# Altium schematic symbol library jlcpcb_2025_04_capacitors_extended_0402.schlib: 3594 symbols (part 16 of 20)
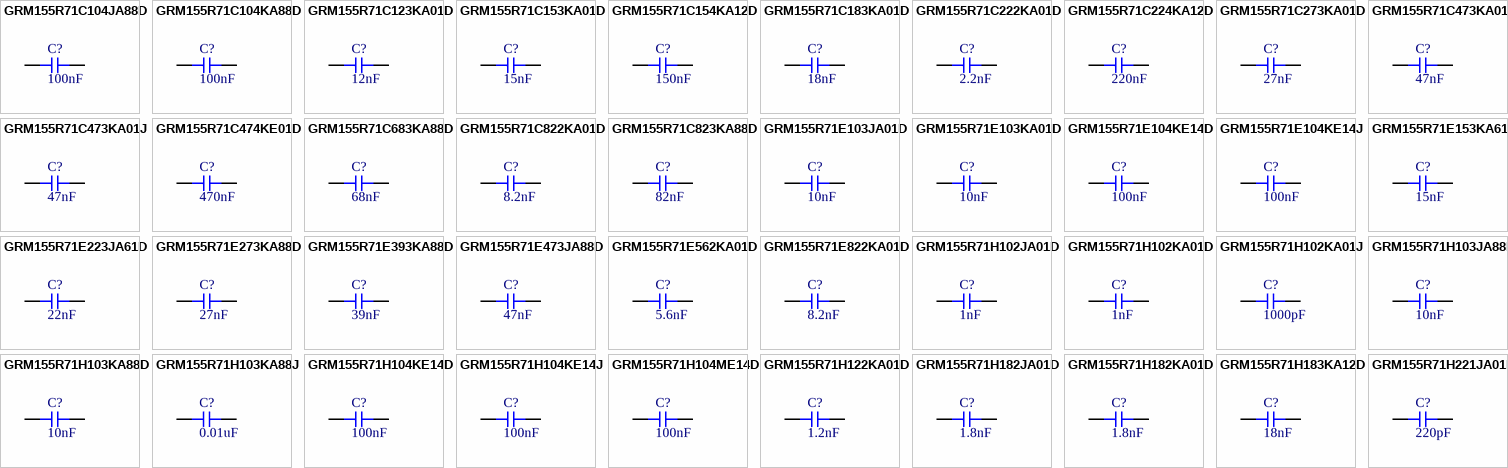
[diagram p104: symbols GRM155R71C104JA88D to GRM155R71H221JA01D]

## GRM155R71E153KA61D
designator C?  Capacitance: 15nF  (hidden comment: *)
Capacitor, Ceramic (MLCC), 15nF, ±10%, 25V, X7R, ±10%, SMD 0402; Manufacturer: Murata Electronics; Manufacturer Part Number: GRM155R71E153KA61D; Package Size: 0402; JLCPCB Basic Part: No; JLCPCB Part Number: C97869; Supplier 1: LCSC; Category: Capacitors - MLCC; Supplier Part Number 1: C97869; Tolerance: ±10%; Voltage Rating: 25V; Temperature Coefficient: X7R; RoHS: Yes; ComponentLink1Description: Datasheet; ComponentLink1URL: https://wmsc.lcsc.com/wmsc/upload/file/pdf/v2/lcsc/1811081531_Murata-Electronics-GRM155R71E153KA61D_C97869.pdf; ComponentLink2Description: JLCPCB Part URL; ComponentLink2URL: https://jlcpcb.com/partdetail/C97869; ComponentLink3Description: LCSC Part URL; ComponentLink3URL: https://lcsc.com/product-detail/Multilayer-Ceramic-Capacitors-MLCC---SMD-SMT_Murata-Electronics-Murata-Electronics-GRM155R71E153KA61D_C97869.html
footprint CAP-0402 (0402 (1005M) Capacitor)
pins: 1, 2

## GRM155R71E223JA61D
designator C?  Capacitance: 22nF  (hidden comment: *)
Capacitor, Ceramic (MLCC), 22nF, ±5%, 25V, X7R, ±5%, SMD 0402; Manufacturer: Murata Electronics; Manufacturer Part Number: GRM155R71E223JA61D; Package Size: 0402; JLCPCB Basic Part: No; JLCPCB Part Number: C426639; Supplier 1: LCSC; Category: Capacitors - MLCC; Supplier Part Number 1: C426639; Tolerance: ±5%; Voltage Rating: 25V; Temperature Coefficient: X7R; RoHS: Yes; ComponentLink1Description: Datasheet; ComponentLink1URL: https://wmsc.lcsc.com/wmsc/upload/file/pdf/v2/lcsc/2304140030_Murata-Electronics-GRM155R71E223JA61D_C426639.pdf; ComponentLink2Description: JLCPCB Part URL; ComponentLink2URL: https://jlcpcb.com/partdetail/C426639; ComponentLink3Description: LCSC Part URL; ComponentLink3URL: https://lcsc.com/product-detail/Multilayer-Ceramic-Capacitors-MLCC---SMD-SMT_Murata-Electronics-Murata-Electronics-GRM155R71E223JA61D_C426639.html
footprint CAP-0402 (0402 (1005M) Capacitor)
pins: 1, 2

## GRM155R71E273KA88D
designator C?  Capacitance: 27nF  (hidden comment: *)
Capacitor, Ceramic (MLCC), 27nF, ±10%, 25V, X7R, ±10%, SMD 0402; Manufacturer: Murata Electronics; Manufacturer Part Number: GRM155R71E273KA88D; Package Size: 0402; JLCPCB Basic Part: No; JLCPCB Part Number: C162187; Supplier 1: LCSC; Category: Capacitors - MLCC; Supplier Part Number 1: C162187; Tolerance: ±10%; Voltage Rating: 25V; Temperature Coefficient: X7R; RoHS: Yes; ComponentLink1Description: Datasheet; ComponentLink1URL: https://wmsc.lcsc.com/wmsc/upload/file/pdf/v2/lcsc/2304140030_Murata-Electronics-GRM155R71E273KA88D_C162187.pdf; ComponentLink2Description: JLCPCB Part URL; ComponentLink2URL: https://jlcpcb.com/partdetail/C162187; ComponentLink3Description: LCSC Part URL; ComponentLink3URL: https://lcsc.com/product-detail/Multilayer-Ceramic-Capacitors-MLCC---SMD-SMT_Murata-Electronics-Murata-Electronics-GRM155R71E273KA88D_C162187.html
footprint CAP-0402 (0402 (1005M) Capacitor)
pins: 1, 2

## GRM155R71E393KA88D
designator C?  Capacitance: 39nF  (hidden comment: *)
Capacitor, Ceramic (MLCC), 39nF, ±10%, 25V, X7R, ±10%, SMD 0402; Manufacturer: Murata Electronics; Manufacturer Part Number: GRM155R71E393KA88D; Package Size: 0402; JLCPCB Basic Part: No; JLCPCB Part Number: C117753; Supplier 1: LCSC; Category: Capacitors - MLCC; Supplier Part Number 1: C117753; Tolerance: ±10%; Voltage Rating: 25V; Temperature Coefficient: X7R; RoHS: Yes; ComponentLink1Description: Datasheet; ComponentLink1URL: https://wmsc.lcsc.com/wmsc/upload/file/pdf/v2/lcsc/2304140030_Murata-Electronics-GRM155R71E393KA88D_C117753.pdf; ComponentLink2Description: JLCPCB Part URL; ComponentLink2URL: https://jlcpcb.com/partdetail/C117753; ComponentLink3Description: LCSC Part URL; ComponentLink3URL: https://lcsc.com/product-detail/Multilayer-Ceramic-Capacitors-MLCC---SMD-SMT_Murata-Electronics-Murata-Electronics-GRM155R71E393KA88D_C117753.html
footprint CAP-0402 (0402 (1005M) Capacitor)
pins: 1, 2

## GRM155R71E473JA88D
designator C?  Capacitance: 47nF  (hidden comment: *)
Capacitor, Ceramic (MLCC), 47nF, ±5%, 25V, X7R, ±5%, SMD 0402; Manufacturer: Murata Electronics; Manufacturer Part Number: GRM155R71E473JA88D; Package Size: 0402; JLCPCB Basic Part: No; JLCPCB Part Number: C437528; Supplier 1: LCSC; Category: Capacitors - MLCC; Supplier Part Number 1: C437528; Tolerance: ±5%; Voltage Rating: 25V; Temperature Coefficient: X7R; RoHS: Yes; ComponentLink1Description: Datasheet; ComponentLink1URL: https://wmsc.lcsc.com/wmsc/upload/file/pdf/v2/lcsc/2304140030_Murata-Electronics-GRM155R71E473JA88D_C437528.pdf; ComponentLink2Description: JLCPCB Part URL; ComponentLink2URL: https://jlcpcb.com/partdetail/C437528; ComponentLink3Description: LCSC Part URL; ComponentLink3URL: https://lcsc.com/product-detail/Multilayer-Ceramic-Capacitors-MLCC---SMD-SMT_Murata-Electronics-Murata-Electronics-GRM155R71E473JA88D_C437528.html
footprint CAP-0402 (0402 (1005M) Capacitor)
pins: 1, 2

## GRM155R71E562KA01D
designator C?  Capacitance: 5.6nF  (hidden comment: *)
Capacitor, Ceramic (MLCC), 5.6nF, ±10%, 25V, X7R, ±10%, SMD 0402; Manufacturer: Murata Electronics; Manufacturer Part Number: GRM155R71E562KA01D; Package Size: 0402; JLCPCB Basic Part: No; JLCPCB Part Number: C162188; Supplier 1: LCSC; Category: Capacitors - MLCC; Supplier Part Number 1: C162188; Tolerance: ±10%; Voltage Rating: 25V; Temperature Coefficient: X7R; RoHS: Yes; ComponentLink1Description: Datasheet; ComponentLink1URL: https://wmsc.lcsc.com/wmsc/upload/file/pdf/v2/lcsc/2101081032_Murata-Electronics-GRM155R71E562KA01D_C162188.pdf; ComponentLink2Description: JLCPCB Part URL; ComponentLink2URL: https://jlcpcb.com/partdetail/C162188; ComponentLink3Description: LCSC Part URL; ComponentLink3URL: https://lcsc.com/product-detail/Multilayer-Ceramic-Capacitors-MLCC---SMD-SMT_Murata-Electronics-Murata-Electronics-GRM155R71E562KA01D_C162188.html
footprint CAP-0402 (0402 (1005M) Capacitor)
pins: 1, 2

## GRM155R71E822KA01D
designator C?  Capacitance: 8.2nF  (hidden comment: *)
Capacitor, Ceramic (MLCC), 8.2nF, ±10%, 25V, X7R, ±10%, SMD 0402; Manufacturer: Murata Electronics; Manufacturer Part Number: GRM155R71E822KA01D; Package Size: 0402; JLCPCB Basic Part: No; JLCPCB Part Number: C701314; Supplier 1: LCSC; Category: Capacitors - MLCC; Supplier Part Number 1: C701314; Tolerance: ±10%; Voltage Rating: 25V; Temperature Coefficient: X7R; RoHS: Yes; ComponentLink1Description: Datasheet; ComponentLink1URL: https://wmsc.lcsc.com/wmsc/upload/file/pdf/v2/lcsc/2304140030_Murata-Electronics-GRM155R71E822KA01D_C701314.pdf; ComponentLink2Description: JLCPCB Part URL; ComponentLink2URL: https://jlcpcb.com/partdetail/C701314; ComponentLink3Description: LCSC Part URL; ComponentLink3URL: https://lcsc.com/product-detail/Multilayer-Ceramic-Capacitors-MLCC---SMD-SMT_Murata-Electronics-Murata-Electronics-GRM155R71E822KA01D_C701314.html
footprint CAP-0402 (0402 (1005M) Capacitor)
pins: 1, 2

## GRM155R71H102JA01D
designator C?  Capacitance: 1nF  (hidden comment: *)
Capacitor, Ceramic (MLCC), 1nF, ±5%, 50V, X7R, ±5%, SMD 0402; Manufacturer: Murata Electronics; Manufacturer Part Number: GRM155R71H102JA01D; Package Size: 0402; JLCPCB Basic Part: No; JLCPCB Part Number: C397298; Supplier 1: LCSC; Category: Capacitors - MLCC; Supplier Part Number 1: C397298; Tolerance: ±5%; Voltage Rating: 50V; Temperature Coefficient: X7R; RoHS: Yes; ComponentLink1Description: Datasheet; ComponentLink1URL: https://wmsc.lcsc.com/wmsc/upload/file/pdf/v2/lcsc/1912111437_Murata-Electronics-GRM155R71H102JA01D_C397298.pdf; ComponentLink2Description: JLCPCB Part URL; ComponentLink2URL: https://jlcpcb.com/partdetail/C397298; ComponentLink3Description: LCSC Part URL; ComponentLink3URL: https://lcsc.com/product-detail/Multilayer-Ceramic-Capacitors-MLCC---SMD-SMT_Murata-Electronics-Murata-Electronics-GRM155R71H102JA01D_C397298.html
footprint CAP-0402 (0402 (1005M) Capacitor)
pins: 1, 2

## GRM155R71H102KA01D
designator C?  Capacitance: 1nF  (hidden comment: *)
Capacitor, Ceramic (MLCC), 1nF, ±10%, 50V, X7R, ±10%, SMD 0402; Manufacturer: Murata Electronics; Manufacturer Part Number: GRM155R71H102KA01D; Package Size: 0402; JLCPCB Basic Part: No; JLCPCB Part Number: C77018; Supplier 1: LCSC; Category: Capacitors - MLCC; Supplier Part Number 1: C77018; Tolerance: ±10%; Voltage Rating: 50V; Temperature Coefficient: X7R; RoHS: Yes; ComponentLink1Description: Datasheet; ComponentLink1URL: https://wmsc.lcsc.com/wmsc/upload/file/pdf/v2/lcsc/1811081615_Murata-Electronics-GRM155R71H102KA01D_C77018.pdf; ComponentLink2Description: JLCPCB Part URL; ComponentLink2URL: https://jlcpcb.com/partdetail/C77018; ComponentLink3Description: LCSC Part URL; ComponentLink3URL: https://lcsc.com/product-detail/Multilayer-Ceramic-Capacitors-MLCC---SMD-SMT_Murata-Electronics-Murata-Electronics-GRM155R71H102KA01D_C77018.html
footprint CAP-0402 (0402 (1005M) Capacitor)
pins: 1, 2

## GRM155R71H102KA01J
designator C?  Capacitance: 1000pF  (hidden comment: *)
Capacitor, Ceramic (MLCC), 1000pF, ±10%, null, X7R, ±10%, SMD 0402; Manufacturer: Murata Electronics; Manufacturer Part Number: GRM155R71H102KA01J; Package Size: 0402; JLCPCB Basic Part: No; JLCPCB Part Number: C3011658; Supplier 1: LCSC; Category: Capacitors - MLCC; Supplier Part Number 1: C3011658; Tolerance: ±10%; Voltage Rating: null; Temperature Coefficient: X7R; RoHS: Yes; ComponentLink1Description: Datasheet; ComponentLink1URL: https://wmsc.lcsc.com/wmsc/upload/file/pdf/v2/lcsc/2301111830_Murata-Electronics-GRM155R71H102KA01J_C3011658.pdf; ComponentLink2Description: JLCPCB Part URL; ComponentLink2URL: https://jlcpcb.com/partdetail/C3011658; ComponentLink3Description: LCSC Part URL; ComponentLink3URL: https://lcsc.com/product-detail/Multilayer-Ceramic-Capacitors-MLCC---SMD-SMT_Murata-Electronics-Murata-Electronics-GRM155R71H102KA01J_C3011658.html
footprint CAP-0402 (0402 (1005M) Capacitor)
pins: 1, 2

## GRM155R71H103JA88D
designator C?  Capacitance: 10nF  (hidden comment: *)
Capacitor, Ceramic (MLCC), 10nF, ±5%, 50V, X7R, ±5%, SMD 0402; Manufacturer: Murata Electronics; Manufacturer Part Number: GRM155R71H103JA88D; Package Size: 0402; JLCPCB Basic Part: No; JLCPCB Part Number: C162190; Supplier 1: LCSC; Category: Capacitors - MLCC; Supplier Part Number 1: C162190; Tolerance: ±5%; Voltage Rating: 50V; Temperature Coefficient: X7R; RoHS: Yes; ComponentLink1Description: Datasheet; ComponentLink1URL: https://wmsc.lcsc.com/wmsc/upload/file/pdf/v2/lcsc/2304140030_Murata-Electronics-GRM155R71H103JA88D_C162190.pdf; ComponentLink2Description: JLCPCB Part URL; ComponentLink2URL: https://jlcpcb.com/partdetail/C162190; ComponentLink3Description: LCSC Part URL; ComponentLink3URL: https://lcsc.com/product-detail/Multilayer-Ceramic-Capacitors-MLCC---SMD-SMT_Murata-Electronics-Murata-Electronics-GRM155R71H103JA88D_C162190.html
footprint CAP-0402 (0402 (1005M) Capacitor)
pins: 1, 2

## GRM155R71H103KA88D
designator C?  Capacitance: 10nF  (hidden comment: *)
Capacitor, Ceramic (MLCC), 10nF, ±10%, 50V, X7R, ±10%, SMD 0402; Manufacturer: Murata Electronics; Manufacturer Part Number: GRM155R71H103KA88D; Package Size: 0402; JLCPCB Basic Part: No; JLCPCB Part Number: C77019; Supplier 1: LCSC; Category: Capacitors - MLCC; Supplier Part Number 1: C77019; Tolerance: ±10%; Voltage Rating: 50V; Temperature Coefficient: X7R; RoHS: Yes; ComponentLink1Description: Datasheet; ComponentLink1URL: https://wmsc.lcsc.com/wmsc/upload/file/pdf/v2/lcsc/1809251103_Murata-Electronics-GRM155R71H103KA88D_C77019.pdf; ComponentLink2Description: JLCPCB Part URL; ComponentLink2URL: https://jlcpcb.com/partdetail/C77019; ComponentLink3Description: LCSC Part URL; ComponentLink3URL: https://lcsc.com/product-detail/Multilayer-Ceramic-Capacitors-MLCC---SMD-SMT_Murata-Electronics-Murata-Electronics-GRM155R71H103KA88D_C77019.html
footprint CAP-0402 (0402 (1005M) Capacitor)
pins: 1, 2

## GRM155R71H103KA88J
designator C?  Capacitance: 0.01uF  (hidden comment: *)
Capacitor, Ceramic (MLCC), 0.01uF, 50V, X7R, SMD 0402; Manufacturer: Murata Electronics; Manufacturer Part Number: GRM155R71H103KA88J; Package Size: 0402; JLCPCB Basic Part: No; JLCPCB Part Number: C2840480; Supplier 1: LCSC; Category: Capacitors - MLCC; Supplier Part Number 1: C2840480; Voltage Rating: 50V; Temperature Coefficient: X7R; RoHS: Yes; ComponentLink1Description: Datasheet; ComponentLink1URL: https://wmsc.lcsc.com/wmsc/upload/file/pdf/v2/lcsc/2301062030_Murata-Electronics-GRM155R71H103KA88J_C2840480.pdf; ComponentLink2Description: JLCPCB Part URL; ComponentLink2URL: https://jlcpcb.com/partdetail/C2840480; ComponentLink3Description: LCSC Part URL; ComponentLink3URL: https://lcsc.com/product-detail/Multilayer-Ceramic-Capacitors-MLCC---SMD-SMT_Murata-Electronics-Murata-Electronics-GRM155R71H103KA88J_C2840480.html
footprint CAP-0402 (0402 (1005M) Capacitor)
pins: 1, 2

## GRM155R71H104KE14D
designator C?  Capacitance: 100nF  (hidden comment: *)
Capacitor, Ceramic (MLCC), 100nF, ±10%, 50V, X7R, ±10%, SMD 0402; Manufacturer: Murata Electronics; Manufacturer Part Number: GRM155R71H104KE14D; Package Size: 0402; JLCPCB Basic Part: No; JLCPCB Part Number: C77020; Supplier 1: LCSC; Category: Capacitors - MLCC; Supplier Part Number 1: C77020; Tolerance: ±10%; Voltage Rating: 50V; Temperature Coefficient: X7R; RoHS: Yes; ComponentLink1Description: Datasheet; ComponentLink1URL: https://wmsc.lcsc.com/wmsc/upload/file/pdf/v2/lcsc/1809272047_Murata-Electronics-GRM155R71H104KE14D_C77020.pdf; ComponentLink2Description: JLCPCB Part URL; ComponentLink2URL: https://jlcpcb.com/partdetail/C77020; ComponentLink3Description: LCSC Part URL; ComponentLink3URL: https://lcsc.com/product-detail/Multilayer-Ceramic-Capacitors-MLCC---SMD-SMT_Murata-Electronics-Murata-Electronics-GRM155R71H104KE14D_C77020.html
footprint CAP-0402 (0402 (1005M) Capacitor)
pins: 1, 2

## GRM155R71H104KE14J
designator C?  Capacitance: 100nF  (hidden comment: *)
Capacitor, Ceramic (MLCC), 100nF, ±10%, null, X7R, ±10%, SMD 0402; Manufacturer: Murata Electronics; Manufacturer Part Number: GRM155R71H104KE14J; Package Size: 0402; JLCPCB Basic Part: No; JLCPCB Part Number: C2649519; Supplier 1: LCSC; Category: Capacitors - MLCC; Supplier Part Number 1: C2649519; Tolerance: ±10%; Voltage Rating: null; Temperature Coefficient: X7R; RoHS: Yes; ComponentLink1Description: Datasheet; ComponentLink1URL: https://wmsc.lcsc.com/wmsc/upload/file/pdf/v2/lcsc/2106080506_Murata-Electronics-GRM155R71H104KE14J_C2649519.pdf; ComponentLink2Description: JLCPCB Part URL; ComponentLink2URL: https://jlcpcb.com/partdetail/C2649519; ComponentLink3Description: LCSC Part URL; ComponentLink3URL: https://lcsc.com/product-detail/Multilayer-Ceramic-Capacitors-MLCC---SMD-SMT_Murata-Electronics-Murata-Electronics-GRM155R71H104KE14J_C2649519.html
footprint CAP-0402 (0402 (1005M) Capacitor)
pins: 1, 2

## GRM155R71H104ME14D
designator C?  Capacitance: 100nF  (hidden comment: *)
Capacitor, Ceramic (MLCC), 100nF, ±20%, 50V, X7R, ±20%, SMD 0402; Manufacturer: Murata Electronics; Manufacturer Part Number: GRM155R71H104ME14D; Package Size: 0402; JLCPCB Basic Part: No; JLCPCB Part Number: C182412; Supplier 1: LCSC; Category: Capacitors - MLCC; Supplier Part Number 1: C182412; Tolerance: ±20%; Voltage Rating: 50V; Temperature Coefficient: X7R; RoHS: Yes; ComponentLink1Description: Datasheet; ComponentLink1URL: https://wmsc.lcsc.com/wmsc/upload/file/pdf/v2/lcsc/2304140030_Murata-Electronics-GRM155R71H104ME14D_C182412.pdf; ComponentLink2Description: JLCPCB Part URL; ComponentLink2URL: https://jlcpcb.com/partdetail/C182412; ComponentLink3Description: LCSC Part URL; ComponentLink3URL: https://lcsc.com/product-detail/Multilayer-Ceramic-Capacitors-MLCC---SMD-SMT_Murata-Electronics-Murata-Electronics-GRM155R71H104ME14D_C182412.html
footprint CAP-0402 (0402 (1005M) Capacitor)
pins: 1, 2

## GRM155R71H122KA01D
designator C?  Capacitance: 1.2nF  (hidden comment: *)
Capacitor, Ceramic (MLCC), 1.2nF, ±10%, 50V, X7R, ±10%, SMD 0402; Manufacturer: Murata Electronics; Manufacturer Part Number: GRM155R71H122KA01D; Package Size: 0402; JLCPCB Basic Part: No; JLCPCB Part Number: C116368; Supplier 1: LCSC; Category: Capacitors - MLCC; Supplier Part Number 1: C116368; Tolerance: ±10%; Voltage Rating: 50V; Temperature Coefficient: X7R; RoHS: Yes; ComponentLink1Description: Datasheet; ComponentLink1URL: https://wmsc.lcsc.com/wmsc/upload/file/pdf/v2/lcsc/2304140030_Murata-Electronics-GRM155R71H122KA01D_C116368.pdf; ComponentLink2Description: JLCPCB Part URL; ComponentLink2URL: https://jlcpcb.com/partdetail/C116368; ComponentLink3Description: LCSC Part URL; ComponentLink3URL: https://lcsc.com/product-detail/Multilayer-Ceramic-Capacitors-MLCC---SMD-SMT_Murata-Electronics-Murata-Electronics-GRM155R71H122KA01D_C116368.html
footprint CAP-0402 (0402 (1005M) Capacitor)
pins: 1, 2

## GRM155R71H182JA01D
designator C?  Capacitance: 1.8nF  (hidden comment: *)
Capacitor, Ceramic (MLCC), 1.8nF, ±5%, 50V, X7R, ±5%, SMD 0402; Manufacturer: Murata Electronics; Manufacturer Part Number: GRM155R71H182JA01D; Package Size: 0402; JLCPCB Basic Part: No; JLCPCB Part Number: C85962; Supplier 1: LCSC; Category: Capacitors - MLCC; Supplier Part Number 1: C85962; Tolerance: ±5%; Voltage Rating: 50V; Temperature Coefficient: X7R; RoHS: Yes; ComponentLink1Description: Datasheet; ComponentLink1URL: https://wmsc.lcsc.com/wmsc/upload/file/pdf/v2/lcsc/2304140030_Murata-Electronics-GRM155R71H182JA01D_C85962.pdf; ComponentLink2Description: JLCPCB Part URL; ComponentLink2URL: https://jlcpcb.com/partdetail/C85962; ComponentLink3Description: LCSC Part URL; ComponentLink3URL: https://lcsc.com/product-detail/Multilayer-Ceramic-Capacitors-MLCC---SMD-SMT_Murata-Electronics-Murata-Electronics-GRM155R71H182JA01D_C85962.html
footprint CAP-0402 (0402 (1005M) Capacitor)
pins: 1, 2

## GRM155R71H182KA01D
designator C?  Capacitance: 1.8nF  (hidden comment: *)
Capacitor, Ceramic (MLCC), 1.8nF, ±10%, 50V, X7R, ±10%, SMD 0402; Manufacturer: Murata Electronics; Manufacturer Part Number: GRM155R71H182KA01D; Package Size: 0402; JLCPCB Basic Part: No; JLCPCB Part Number: C162192; Supplier 1: LCSC; Category: Capacitors - MLCC; Supplier Part Number 1: C162192; Tolerance: ±10%; Voltage Rating: 50V; Temperature Coefficient: X7R; RoHS: Yes; ComponentLink1Description: Datasheet; ComponentLink1URL: https://wmsc.lcsc.com/wmsc/upload/file/pdf/v2/lcsc/1912111437_Murata-Electronics-GRM155R71H182KA01D_C162192.pdf; ComponentLink2Description: JLCPCB Part URL; ComponentLink2URL: https://jlcpcb.com/partdetail/C162192; ComponentLink3Description: LCSC Part URL; ComponentLink3URL: https://lcsc.com/product-detail/Multilayer-Ceramic-Capacitors-MLCC---SMD-SMT_Murata-Electronics-Murata-Electronics-GRM155R71H182KA01D_C162192.html
footprint CAP-0402 (0402 (1005M) Capacitor)
pins: 1, 2

## GRM155R71H183KA12D
designator C?  Capacitance: 18nF  (hidden comment: *)
Capacitor, Ceramic (MLCC), 18nF, ±10%, 50V, X7R, ±10%, SMD 0402; Manufacturer: Murata Electronics; Manufacturer Part Number: GRM155R71H183KA12D; Package Size: 0402; JLCPCB Basic Part: No; JLCPCB Part Number: C437529; Supplier 1: LCSC; Category: Capacitors - MLCC; Supplier Part Number 1: C437529; Tolerance: ±10%; Voltage Rating: 50V; Temperature Coefficient: X7R; RoHS: Yes; ComponentLink1Description: Datasheet; ComponentLink1URL: https://wmsc.lcsc.com/wmsc/upload/file/pdf/v2/lcsc/2304140030_Murata-Electronics-GRM155R71H183KA12D_C437529.pdf; ComponentLink2Description: JLCPCB Part URL; ComponentLink2URL: https://jlcpcb.com/partdetail/C437529; ComponentLink3Description: LCSC Part URL; ComponentLink3URL: https://lcsc.com/product-detail/Multilayer-Ceramic-Capacitors-MLCC---SMD-SMT_Murata-Electronics-Murata-Electronics-GRM155R71H183KA12D_C437529.html
footprint CAP-0402 (0402 (1005M) Capacitor)
pins: 1, 2

## GRM155R71H221JA01D
designator C?  Capacitance: 220pF  (hidden comment: *)
Capacitor, Ceramic (MLCC), 220pF, ±5%, null, X7R, ±5%, SMD 0402; Manufacturer: Murata Electronics; Manufacturer Part Number: GRM155R71H221JA01D; Package Size: 0402; JLCPCB Basic Part: No; JLCPCB Part Number: C882535; Supplier 1: LCSC; Category: Capacitors - MLCC; Supplier Part Number 1: C882535; Tolerance: ±5%; Voltage Rating: null; Temperature Coefficient: X7R; RoHS: Yes; ComponentLink1Description: Datasheet; ComponentLink1URL: https://wmsc.lcsc.com/wmsc/upload/file/pdf/v2/lcsc/2201242130_Murata-Electronics-GRM155R71H221JA01D_C882535.pdf; ComponentLink2Description: JLCPCB Part URL; ComponentLink2URL: https://jlcpcb.com/partdetail/C882535; ComponentLink3Description: LCSC Part URL; ComponentLink3URL: https://lcsc.com/product-detail/Multilayer-Ceramic-Capacitors-MLCC---SMD-SMT_Murata-Electronics-Murata-Electronics-GRM155R71H221JA01D_C882535.html
footprint CAP-0402 (0402 (1005M) Capacitor)
pins: 1, 2

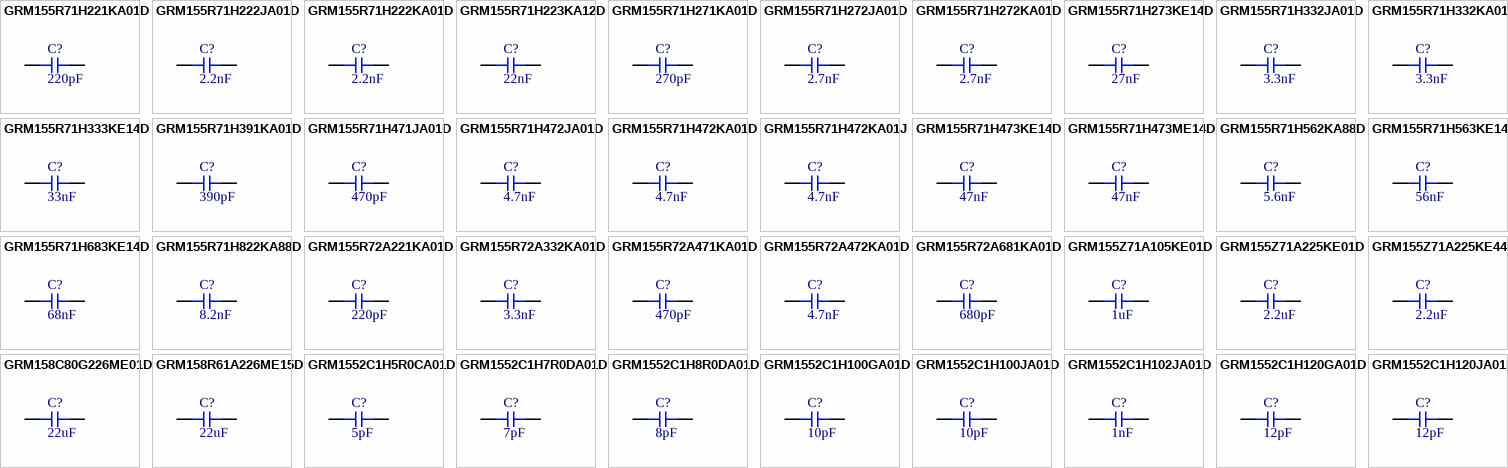
[diagram p70: symbols GRM155R71H221KA01D to GRM1552C1H120JA01D]

## GRM155R71H221KA01D
designator C?  Capacitance: 220pF  (hidden comment: *)
Capacitor, Ceramic (MLCC), 220pF, ±10%, 50V, X7R, ±10%, SMD 0402; Manufacturer: Murata Electronics; Manufacturer Part Number: GRM155R71H221KA01D; Package Size: 0402; JLCPCB Basic Part: No; JLCPCB Part Number: C97872; Supplier 1: LCSC; Category: Capacitors - MLCC; Supplier Part Number 1: C97872; Tolerance: ±10%; Voltage Rating: 50V; Temperature Coefficient: X7R; RoHS: Yes; ComponentLink1Description: Datasheet; ComponentLink1URL: https://wmsc.lcsc.com/wmsc/upload/file/pdf/v2/lcsc/1811081531_Murata-Electronics-GRM155R71H221KA01D_C97872.pdf; ComponentLink2Description: JLCPCB Part URL; ComponentLink2URL: https://jlcpcb.com/partdetail/C97872; ComponentLink3Description: LCSC Part URL; ComponentLink3URL: https://lcsc.com/product-detail/Multilayer-Ceramic-Capacitors-MLCC---SMD-SMT_Murata-Electronics-Murata-Electronics-GRM155R71H221KA01D_C97872.html
footprint CAP-0402 (0402 (1005M) Capacitor)
pins: 1, 2

## GRM155R71H222JA01D
designator C?  Capacitance: 2.2nF  (hidden comment: *)
Capacitor, Ceramic (MLCC), 2.2nF, ±5%, 50V, X7R, ±5%, SMD 0402; Manufacturer: Murata Electronics; Manufacturer Part Number: GRM155R71H222JA01D; Package Size: 0402; JLCPCB Basic Part: No; JLCPCB Part Number: C492066; Supplier 1: LCSC; Category: Capacitors - MLCC; Supplier Part Number 1: C492066; Tolerance: ±5%; Voltage Rating: 50V; Temperature Coefficient: X7R; RoHS: Yes; ComponentLink1Description: Datasheet; ComponentLink1URL: https://wmsc.lcsc.com/wmsc/upload/file/pdf/v2/lcsc/2308111638_Murata-Electronics-GRM155R71H222JA01D_C492066.pdf; ComponentLink2Description: JLCPCB Part URL; ComponentLink2URL: https://jlcpcb.com/partdetail/C492066; ComponentLink3Description: LCSC Part URL; ComponentLink3URL: https://lcsc.com/product-detail/Multilayer-Ceramic-Capacitors-MLCC---SMD-SMT_Murata-Electronics-Murata-Electronics-GRM155R71H222JA01D_C492066.html
footprint CAP-0402 (0402 (1005M) Capacitor)
pins: 1, 2

## GRM155R71H222KA01D
designator C?  Capacitance: 2.2nF  (hidden comment: *)
Capacitor, Ceramic (MLCC), 2.2nF, ±10%, 50V, X7R, ±10%, SMD 0402; Manufacturer: Murata Electronics; Manufacturer Part Number: GRM155R71H222KA01D; Package Size: 0402; JLCPCB Basic Part: No; JLCPCB Part Number: C77022; Supplier 1: LCSC; Category: Capacitors - MLCC; Supplier Part Number 1: C77022; Tolerance: ±10%; Voltage Rating: 50V; Temperature Coefficient: X7R; RoHS: Yes; ComponentLink1Description: Datasheet; ComponentLink1URL: https://wmsc.lcsc.com/wmsc/upload/file/pdf/v2/lcsc/1810291410_Murata-Electronics-GRM155R71H222KA01D_C77022.pdf; ComponentLink2Description: JLCPCB Part URL; ComponentLink2URL: https://jlcpcb.com/partdetail/C77022; ComponentLink3Description: LCSC Part URL; ComponentLink3URL: https://lcsc.com/product-detail/Multilayer-Ceramic-Capacitors-MLCC---SMD-SMT_Murata-Electronics-Murata-Electronics-GRM155R71H222KA01D_C77022.html
footprint CAP-0402 (0402 (1005M) Capacitor)
pins: 1, 2

## GRM155R71H223KA12D
designator C?  Capacitance: 22nF  (hidden comment: *)
Capacitor, Ceramic (MLCC), 22nF, ±10%, 50V, X7R, ±10%, SMD 0402; Manufacturer: Murata Electronics; Manufacturer Part Number: GRM155R71H223KA12D; Package Size: 0402; JLCPCB Basic Part: No; JLCPCB Part Number: C77023; Supplier 1: LCSC; Category: Capacitors - MLCC; Supplier Part Number 1: C77023; Tolerance: ±10%; Voltage Rating: 50V; Temperature Coefficient: X7R; RoHS: Yes; ComponentLink1Description: Datasheet; ComponentLink1URL: https://wmsc.lcsc.com/wmsc/upload/file/pdf/v2/lcsc/1811081613_Murata-Electronics-GRM155R71H223KA12D_C77023.pdf; ComponentLink2Description: JLCPCB Part URL; ComponentLink2URL: https://jlcpcb.com/partdetail/C77023; ComponentLink3Description: LCSC Part URL; ComponentLink3URL: https://lcsc.com/product-detail/Multilayer-Ceramic-Capacitors-MLCC---SMD-SMT_Murata-Electronics-Murata-Electronics-GRM155R71H223KA12D_C77023.html
footprint CAP-0402 (0402 (1005M) Capacitor)
pins: 1, 2

## GRM155R71H271KA01D
designator C?  Capacitance: 270pF  (hidden comment: *)
Capacitor, Ceramic (MLCC), 270pF, ±10%, 50V, X7R, ±10%, SMD 0402; Manufacturer: Murata Electronics; Manufacturer Part Number: GRM155R71H271KA01D; Package Size: 0402; JLCPCB Basic Part: No; JLCPCB Part Number: C415375; Supplier 1: LCSC; Category: Capacitors - MLCC; Supplier Part Number 1: C415375; Tolerance: ±10%; Voltage Rating: 50V; Temperature Coefficient: X7R; RoHS: Yes; ComponentLink1Description: Datasheet; ComponentLink1URL: https://wmsc.lcsc.com/wmsc/upload/file/pdf/v2/lcsc/2304140030_Murata-Electronics-GRM155R71H271KA01D_C415375.pdf; ComponentLink2Description: JLCPCB Part URL; ComponentLink2URL: https://jlcpcb.com/partdetail/C415375; ComponentLink3Description: LCSC Part URL; ComponentLink3URL: https://lcsc.com/product-detail/Multilayer-Ceramic-Capacitors-MLCC---SMD-SMT_Murata-Electronics-Murata-Electronics-GRM155R71H271KA01D_C415375.html
footprint CAP-0402 (0402 (1005M) Capacitor)
pins: 1, 2

## GRM155R71H272JA01D
designator C?  Capacitance: 2.7nF  (hidden comment: *)
Capacitor, Ceramic (MLCC), 2.7nF, ±5%, null, X7R, ±5%, SMD 0402; Manufacturer: Murata Electronics; Manufacturer Part Number: GRM155R71H272JA01D; Package Size: 0402; JLCPCB Basic Part: No; JLCPCB Part Number: C440175; Supplier 1: LCSC; Category: Capacitors - MLCC; Supplier Part Number 1: C440175; Tolerance: ±5%; Voltage Rating: null; Temperature Coefficient: X7R; RoHS: Yes; ComponentLink1Description: Datasheet; ComponentLink1URL: https://wmsc.lcsc.com/wmsc/upload/file/pdf/v2/lcsc/2304140030_Murata-Electronics-GRM155R71H272JA01D_C440175.pdf; ComponentLink2Description: JLCPCB Part URL; ComponentLink2URL: https://jlcpcb.com/partdetail/C440175; ComponentLink3Description: LCSC Part URL; ComponentLink3URL: https://lcsc.com/product-detail/Multilayer-Ceramic-Capacitors-MLCC---SMD-SMT_Murata-Electronics-Murata-Electronics-GRM155R71H272JA01D_C440175.html
footprint CAP-0402 (0402 (1005M) Capacitor)
pins: 1, 2

## GRM155R71H272KA01D
designator C?  Capacitance: 2.7nF  (hidden comment: *)
Capacitor, Ceramic (MLCC), 2.7nF, ±10%, 50V, X7R, ±10%, SMD 0402; Manufacturer: Murata Electronics; Manufacturer Part Number: GRM155R71H272KA01D; Package Size: 0402; JLCPCB Basic Part: No; JLCPCB Part Number: C162193; Supplier 1: LCSC; Category: Capacitors - MLCC; Supplier Part Number 1: C162193; Tolerance: ±10%; Voltage Rating: 50V; Temperature Coefficient: X7R; RoHS: Yes; ComponentLink1Description: Datasheet; ComponentLink1URL: https://wmsc.lcsc.com/wmsc/upload/file/pdf/v2/lcsc/2304140030_Murata-Electronics-GRM155R71H272KA01D_C162193.pdf; ComponentLink2Description: JLCPCB Part URL; ComponentLink2URL: https://jlcpcb.com/partdetail/C162193; ComponentLink3Description: LCSC Part URL; ComponentLink3URL: https://lcsc.com/product-detail/Multilayer-Ceramic-Capacitors-MLCC---SMD-SMT_Murata-Electronics-Murata-Electronics-GRM155R71H272KA01D_C162193.html
footprint CAP-0402 (0402 (1005M) Capacitor)
pins: 1, 2

## GRM155R71H273KE14D
designator C?  Capacitance: 27nF  (hidden comment: *)
Capacitor, Ceramic (MLCC), 27nF, ±10%, null, X7R, ±10%, SMD 0402; Manufacturer: Murata Electronics; Manufacturer Part Number: GRM155R71H273KE14D; Package Size: 0402; JLCPCB Basic Part: No; JLCPCB Part Number: C882534; Supplier 1: LCSC; Category: Capacitors - MLCC; Supplier Part Number 1: C882534; Tolerance: ±10%; Voltage Rating: null; Temperature Coefficient: X7R; RoHS: Yes; ComponentLink1Description: Datasheet; ComponentLink1URL: https://wmsc.lcsc.com/wmsc/upload/file/pdf/v2/lcsc/2201242130_Murata-Electronics-GRM155R71H273KE14D_C882534.pdf; ComponentLink2Description: JLCPCB Part URL; ComponentLink2URL: https://jlcpcb.com/partdetail/C882534; ComponentLink3Description: LCSC Part URL; ComponentLink3URL: https://lcsc.com/product-detail/Multilayer-Ceramic-Capacitors-MLCC---SMD-SMT_Murata-Electronics-Murata-Electronics-GRM155R71H273KE14D_C882534.html
footprint CAP-0402 (0402 (1005M) Capacitor)
pins: 1, 2

## GRM155R71H332JA01D
designator C?  Capacitance: 3.3nF  (hidden comment: *)
Capacitor, Ceramic (MLCC), 3.3nF, ±5%, 50V, X7R, ±5%, SMD 0402; Manufacturer: Murata Electronics; Manufacturer Part Number: GRM155R71H332JA01D; Package Size: 0402; JLCPCB Basic Part: No; JLCPCB Part Number: C389529; Supplier 1: LCSC; Category: Capacitors - MLCC; Supplier Part Number 1: C389529; Tolerance: ±5%; Voltage Rating: 50V; Temperature Coefficient: X7R; RoHS: Yes; ComponentLink1Description: Datasheet; ComponentLink1URL: https://wmsc.lcsc.com/wmsc/upload/file/pdf/v2/lcsc/2304140030_Murata-Electronics-GRM155R71H332JA01D_C389529.pdf; ComponentLink2Description: JLCPCB Part URL; ComponentLink2URL: https://jlcpcb.com/partdetail/C389529; ComponentLink3Description: LCSC Part URL; ComponentLink3URL: https://lcsc.com/product-detail/Multilayer-Ceramic-Capacitors-MLCC---SMD-SMT_Murata-Electronics-Murata-Electronics-GRM155R71H332JA01D_C389529.html
footprint CAP-0402 (0402 (1005M) Capacitor)
pins: 1, 2

## GRM155R71H332KA01D
designator C?  Capacitance: 3.3nF  (hidden comment: *)
Capacitor, Ceramic (MLCC), 3.3nF, ±10%, 50V, X7R, ±10%, SMD 0402; Manufacturer: Murata Electronics; Manufacturer Part Number: GRM155R71H332KA01D; Package Size: 0402; JLCPCB Basic Part: No; JLCPCB Part Number: C85963; Supplier 1: LCSC; Category: Capacitors - MLCC; Supplier Part Number 1: C85963; Tolerance: ±10%; Voltage Rating: 50V; Temperature Coefficient: X7R; RoHS: Yes; ComponentLink1Description: Datasheet; ComponentLink1URL: https://wmsc.lcsc.com/wmsc/upload/file/pdf/v2/lcsc/2304140030_Murata-Electronics-GRM155R71H332KA01D_C85963.pdf; ComponentLink2Description: JLCPCB Part URL; ComponentLink2URL: https://jlcpcb.com/partdetail/C85963; ComponentLink3Description: LCSC Part URL; ComponentLink3URL: https://lcsc.com/product-detail/Multilayer-Ceramic-Capacitors-MLCC---SMD-SMT_Murata-Electronics-Murata-Electronics-GRM155R71H332KA01D_C85963.html
footprint CAP-0402 (0402 (1005M) Capacitor)
pins: 1, 2

## GRM155R71H333KE14D
designator C?  Capacitance: 33nF  (hidden comment: *)
Capacitor, Ceramic (MLCC), 33nF, ±10%, 50V, X7R, ±10%, SMD 0402; Manufacturer: Murata Electronics; Manufacturer Part Number: GRM155R71H333KE14D; Package Size: 0402; JLCPCB Basic Part: No; JLCPCB Part Number: C415530; Supplier 1: LCSC; Category: Capacitors - MLCC; Supplier Part Number 1: C415530; Tolerance: ±10%; Voltage Rating: 50V; Temperature Coefficient: X7R; RoHS: Yes; ComponentLink1Description: Datasheet; ComponentLink1URL: https://wmsc.lcsc.com/wmsc/upload/file/pdf/v2/lcsc/2304140030_Murata-Electronics-GRM155R71H333KE14D_C415530.pdf; ComponentLink2Description: JLCPCB Part URL; ComponentLink2URL: https://jlcpcb.com/partdetail/C415530; ComponentLink3Description: LCSC Part URL; ComponentLink3URL: https://lcsc.com/product-detail/Multilayer-Ceramic-Capacitors-MLCC---SMD-SMT_Murata-Electronics-Murata-Electronics-GRM155R71H333KE14D_C415530.html
footprint CAP-0402 (0402 (1005M) Capacitor)
pins: 1, 2

## GRM155R71H391KA01D
designator C?  Capacitance: 390pF  (hidden comment: *)
Capacitor, Ceramic (MLCC), 390pF, ±10%, 50V, X7R, ±10%, SMD 0402; Manufacturer: Murata Electronics; Manufacturer Part Number: GRM155R71H391KA01D; Package Size: 0402; JLCPCB Basic Part: No; JLCPCB Part Number: C185563; Supplier 1: LCSC; Category: Capacitors - MLCC; Supplier Part Number 1: C185563; Tolerance: ±10%; Voltage Rating: 50V; Temperature Coefficient: X7R; RoHS: Yes; ComponentLink1Description: Datasheet; ComponentLink1URL: https://wmsc.lcsc.com/wmsc/upload/file/pdf/v2/lcsc/1912111437_Murata-Electronics-GRM155R71H391KA01D_C185563.pdf; ComponentLink2Description: JLCPCB Part URL; ComponentLink2URL: https://jlcpcb.com/partdetail/C185563; ComponentLink3Description: LCSC Part URL; ComponentLink3URL: https://lcsc.com/product-detail/Multilayer-Ceramic-Capacitors-MLCC---SMD-SMT_Murata-Electronics-Murata-Electronics-GRM155R71H391KA01D_C185563.html
footprint CAP-0402 (0402 (1005M) Capacitor)
pins: 1, 2

## GRM155R71H471JA01D
designator C?  Capacitance: 470pF  (hidden comment: *)
Capacitor, Ceramic (MLCC), 470pF, ±5%, 50V, X7R, ±5%, SMD 0402; Manufacturer: Murata Electronics; Manufacturer Part Number: GRM155R71H471JA01D; Package Size: 0402; JLCPCB Basic Part: No; JLCPCB Part Number: C415539; Supplier 1: LCSC; Category: Capacitors - MLCC; Supplier Part Number 1: C415539; Tolerance: ±5%; Voltage Rating: 50V; Temperature Coefficient: X7R; RoHS: Yes; ComponentLink1Description: Datasheet; ComponentLink1URL: https://wmsc.lcsc.com/wmsc/upload/file/pdf/v2/lcsc/2304140030_Murata-Electronics-GRM155R71H471JA01D_C415539.pdf; ComponentLink2Description: JLCPCB Part URL; ComponentLink2URL: https://jlcpcb.com/partdetail/C415539; ComponentLink3Description: LCSC Part URL; ComponentLink3URL: https://lcsc.com/product-detail/Multilayer-Ceramic-Capacitors-MLCC---SMD-SMT_Murata-Electronics-Murata-Electronics-GRM155R71H471JA01D_C415539.html
footprint CAP-0402 (0402 (1005M) Capacitor)
pins: 1, 2

## GRM155R71H472JA01D
designator C?  Capacitance: 4.7nF  (hidden comment: *)
Capacitor, Ceramic (MLCC), 4.7nF, ±5%, null, X7R, ±5%, SMD 0402; Manufacturer: Murata Electronics; Manufacturer Part Number: GRM155R71H472JA01D; Package Size: 0402; JLCPCB Basic Part: No; JLCPCB Part Number: C913548; Supplier 1: LCSC; Category: Capacitors - MLCC; Supplier Part Number 1: C913548; Tolerance: ±5%; Voltage Rating: null; Temperature Coefficient: X7R; RoHS: Yes; ComponentLink1Description: Datasheet; ComponentLink1URL: https://wmsc.lcsc.com/wmsc/upload/file/pdf/v2/lcsc/2201131300_Murata-Electronics-GRM155R71H472JA01D_C913548.pdf; ComponentLink2Description: JLCPCB Part URL; ComponentLink2URL: https://jlcpcb.com/partdetail/C913548; ComponentLink3Description: LCSC Part URL; ComponentLink3URL: https://lcsc.com/product-detail/Multilayer-Ceramic-Capacitors-MLCC---SMD-SMT_Murata-Electronics-Murata-Electronics-GRM155R71H472JA01D_C913548.html
footprint CAP-0402 (0402 (1005M) Capacitor)
pins: 1, 2

## GRM155R71H472KA01D
designator C?  Capacitance: 4.7nF  (hidden comment: *)
Capacitor, Ceramic (MLCC), 4.7nF, ±10%, 50V, X7R, ±10%, SMD 0402; Manufacturer: Murata Electronics; Manufacturer Part Number: GRM155R71H472KA01D; Package Size: 0402; JLCPCB Basic Part: No; JLCPCB Part Number: C77024; Supplier 1: LCSC; Category: Capacitors - MLCC; Supplier Part Number 1: C77024; Tolerance: ±10%; Voltage Rating: 50V; Temperature Coefficient: X7R; RoHS: Yes; ComponentLink1Description: Datasheet; ComponentLink1URL: https://wmsc.lcsc.com/wmsc/upload/file/pdf/v2/lcsc/1811081615_Murata-Electronics-GRM155R71H472KA01D_C77024.pdf; ComponentLink2Description: JLCPCB Part URL; ComponentLink2URL: https://jlcpcb.com/partdetail/C77024; ComponentLink3Description: LCSC Part URL; ComponentLink3URL: https://lcsc.com/product-detail/Multilayer-Ceramic-Capacitors-MLCC---SMD-SMT_Murata-Electronics-Murata-Electronics-GRM155R71H472KA01D_C77024.html
footprint CAP-0402 (0402 (1005M) Capacitor)
pins: 1, 2

## GRM155R71H472KA01J
designator C?  Capacitance: 4.7nF  (hidden comment: *)
Capacitor, Ceramic (MLCC), 4.7nF, ±10%, 50V, X7R, ±10%, SMD 0402; Manufacturer: Murata Electronics; Manufacturer Part Number: GRM155R71H472KA01J; Package Size: 0402; JLCPCB Basic Part: No; JLCPCB Part Number: C2168177; Supplier 1: LCSC; Category: Capacitors - MLCC; Supplier Part Number 1: C2168177; Tolerance: ±10%; Voltage Rating: 50V; Temperature Coefficient: X7R; RoHS: Yes; ComponentLink1Description: Datasheet; ComponentLink1URL: https://wmsc.lcsc.com/wmsc/upload/file/pdf/v2/lcsc/2308111716_Murata-Electronics-GRM155R71H472KA01J_C2168177.pdf; ComponentLink2Description: JLCPCB Part URL; ComponentLink2URL: https://jlcpcb.com/partdetail/C2168177; ComponentLink3Description: LCSC Part URL; ComponentLink3URL: https://lcsc.com/product-detail/Multilayer-Ceramic-Capacitors-MLCC---SMD-SMT_Murata-Electronics-Murata-Electronics-GRM155R71H472KA01J_C2168177.html
footprint CAP-0402 (0402 (1005M) Capacitor)
pins: 1, 2

## GRM155R71H473KE14D
designator C?  Capacitance: 47nF  (hidden comment: *)
Capacitor, Ceramic (MLCC), 47nF, ±20%, 50V, X7R, ±20%, SMD 0402; Manufacturer: Murata Electronics; Manufacturer Part Number: GRM155R71H473KE14D; Package Size: 0402; JLCPCB Basic Part: No; JLCPCB Part Number: C117757; Supplier 1: LCSC; Category: Capacitors - MLCC; Supplier Part Number 1: C117757; Tolerance: ±20%; Voltage Rating: 50V; Temperature Coefficient: X7R; RoHS: Yes; ComponentLink1Description: Datasheet; ComponentLink1URL: https://wmsc.lcsc.com/wmsc/upload/file/pdf/v2/lcsc/2303241430_Murata-Electronics-GRM155R71H473KE14D_C117757.pdf; ComponentLink2Description: JLCPCB Part URL; ComponentLink2URL: https://jlcpcb.com/partdetail/C117757; ComponentLink3Description: LCSC Part URL; ComponentLink3URL: https://lcsc.com/product-detail/Multilayer-Ceramic-Capacitors-MLCC---SMD-SMT_Murata-Electronics-Murata-Electronics-GRM155R71H473KE14D_C117757.html
footprint CAP-0402 (0402 (1005M) Capacitor)
pins: 1, 2

## GRM155R71H473ME14D
designator C?  Capacitance: 47nF  (hidden comment: *)
Capacitor, Ceramic (MLCC), 47nF, ±20%, 50V, X7R, ±20%, SMD 0402; Manufacturer: Murata Electronics; Manufacturer Part Number: GRM155R71H473ME14D; Package Size: 0402; JLCPCB Basic Part: No; JLCPCB Part Number: C2183913; Supplier 1: LCSC; Category: Capacitors - MLCC; Supplier Part Number 1: C2183913; Tolerance: ±20%; Voltage Rating: 50V; Temperature Coefficient: X7R; RoHS: Yes; ComponentLink1Description: Datasheet; ComponentLink1URL: https://wmsc.lcsc.com/wmsc/upload/file/pdf/v2/lcsc/2202041400_Murata-Electronics-GRM155R71H473ME14D_C2183913.pdf; ComponentLink2Description: JLCPCB Part URL; ComponentLink2URL: https://jlcpcb.com/partdetail/C2183913; ComponentLink3Description: LCSC Part URL; ComponentLink3URL: https://lcsc.com/product-detail/Multilayer-Ceramic-Capacitors-MLCC---SMD-SMT_Murata-Electronics-Murata-Electronics-GRM155R71H473ME14D_C2183913.html
footprint CAP-0402 (0402 (1005M) Capacitor)
pins: 1, 2

## GRM155R71H562KA88D
designator C?  Capacitance: 5.6nF  (hidden comment: *)
Capacitor, Ceramic (MLCC), 5.6nF, ±10%, 50V, X7R, ±10%, SMD 0402; Manufacturer: Murata Electronics; Manufacturer Part Number: GRM155R71H562KA88D; Package Size: 0402; JLCPCB Basic Part: No; JLCPCB Part Number: C162195; Supplier 1: LCSC; Category: Capacitors - MLCC; Supplier Part Number 1: C162195; Tolerance: ±10%; Voltage Rating: 50V; Temperature Coefficient: X7R; RoHS: Yes; ComponentLink1Description: Datasheet; ComponentLink1URL: https://wmsc.lcsc.com/wmsc/upload/file/pdf/v2/lcsc/1912111437_Murata-Electronics-GRM155R71H562KA88D_C162195.pdf; ComponentLink2Description: JLCPCB Part URL; ComponentLink2URL: https://jlcpcb.com/partdetail/C162195; ComponentLink3Description: LCSC Part URL; ComponentLink3URL: https://lcsc.com/product-detail/Multilayer-Ceramic-Capacitors-MLCC---SMD-SMT_Murata-Electronics-Murata-Electronics-GRM155R71H562KA88D_C162195.html
footprint CAP-0402 (0402 (1005M) Capacitor)
pins: 1, 2

## GRM155R71H563KE14D
designator C?  Capacitance: 56nF  (hidden comment: *)
Capacitor, Ceramic (MLCC), 56nF, ±10%, null, X7R, ±10%, SMD 0402; Manufacturer: Murata Electronics; Manufacturer Part Number: GRM155R71H563KE14D; Package Size: 0402; JLCPCB Basic Part: No; JLCPCB Part Number: C882532; Supplier 1: LCSC; Category: Capacitors - MLCC; Supplier Part Number 1: C882532; Tolerance: ±10%; Voltage Rating: null; Temperature Coefficient: X7R; RoHS: Yes; ComponentLink1Description: Datasheet; ComponentLink1URL: https://wmsc.lcsc.com/wmsc/upload/file/pdf/v2/lcsc/2201242130_Murata-Electronics-GRM155R71H563KE14D_C882532.pdf; ComponentLink2Description: JLCPCB Part URL; ComponentLink2URL: https://jlcpcb.com/partdetail/C882532; ComponentLink3Description: LCSC Part URL; ComponentLink3URL: https://lcsc.com/product-detail/Multilayer-Ceramic-Capacitors-MLCC---SMD-SMT_Murata-Electronics-Murata-Electronics-GRM155R71H563KE14D_C882532.html
footprint CAP-0402 (0402 (1005M) Capacitor)
pins: 1, 2

## GRM155R71H683KE14D
designator C?  Capacitance: 68nF  (hidden comment: *)
Capacitor, Ceramic (MLCC), 68nF, ±10%, 50V, X7R, ±10%, SMD 0402; Manufacturer: Murata Electronics; Manufacturer Part Number: GRM155R71H683KE14D; Package Size: 0402; JLCPCB Basic Part: No; JLCPCB Part Number: C117767; Supplier 1: LCSC; Category: Capacitors - MLCC; Supplier Part Number 1: C117767; Tolerance: ±10%; Voltage Rating: 50V; Temperature Coefficient: X7R; RoHS: Yes; ComponentLink1Description: Datasheet; ComponentLink1URL: https://wmsc.lcsc.com/wmsc/upload/file/pdf/v2/lcsc/2304140030_Murata-Electronics-GRM155R71H683KE14D_C117767.pdf; ComponentLink2Description: JLCPCB Part URL; ComponentLink2URL: https://jlcpcb.com/partdetail/C117767; ComponentLink3Description: LCSC Part URL; ComponentLink3URL: https://lcsc.com/product-detail/Multilayer-Ceramic-Capacitors-MLCC---SMD-SMT_Murata-Electronics-Murata-Electronics-GRM155R71H683KE14D_C117767.html
footprint CAP-0402 (0402 (1005M) Capacitor)
pins: 1, 2

## GRM155R71H822KA88D
designator C?  Capacitance: 8.2nF  (hidden comment: *)
Capacitor, Ceramic (MLCC), 8.2nF, ±10%, 50V, X7R, ±10%, SMD 0402; Manufacturer: Murata Electronics; Manufacturer Part Number: GRM155R71H822KA88D; Package Size: 0402; JLCPCB Basic Part: No; JLCPCB Part Number: C882531; Supplier 1: LCSC; Category: Capacitors - MLCC; Supplier Part Number 1: C882531; Tolerance: ±10%; Voltage Rating: 50V; Temperature Coefficient: X7R; RoHS: Yes; ComponentLink1Description: Datasheet; ComponentLink1URL: https://wmsc.lcsc.com/wmsc/upload/file/pdf/v2/lcsc/2206211730_Murata-Electronics-GRM155R71H822KA88D_C882531.pdf; ComponentLink2Description: JLCPCB Part URL; ComponentLink2URL: https://jlcpcb.com/partdetail/C882531; ComponentLink3Description: LCSC Part URL; ComponentLink3URL: https://lcsc.com/product-detail/Multilayer-Ceramic-Capacitors-MLCC---SMD-SMT_Murata-Electronics-Murata-Electronics-GRM155R71H822KA88D_C882531.html
footprint CAP-0402 (0402 (1005M) Capacitor)
pins: 1, 2
